# Altium footprint library Connectors SMD.PcbLib: 130 footprints (part 4 of 12)
Each footprint in its own frame and in the unit in brackets; x right, y up, seen from the top. Pads: shape width x height; smd on the part's side, far side on the other; paste and mask are expansions set on the pad; w line width, h text height; cw(c..) or ccw(c..) is an arc to the next point about the centre after c.
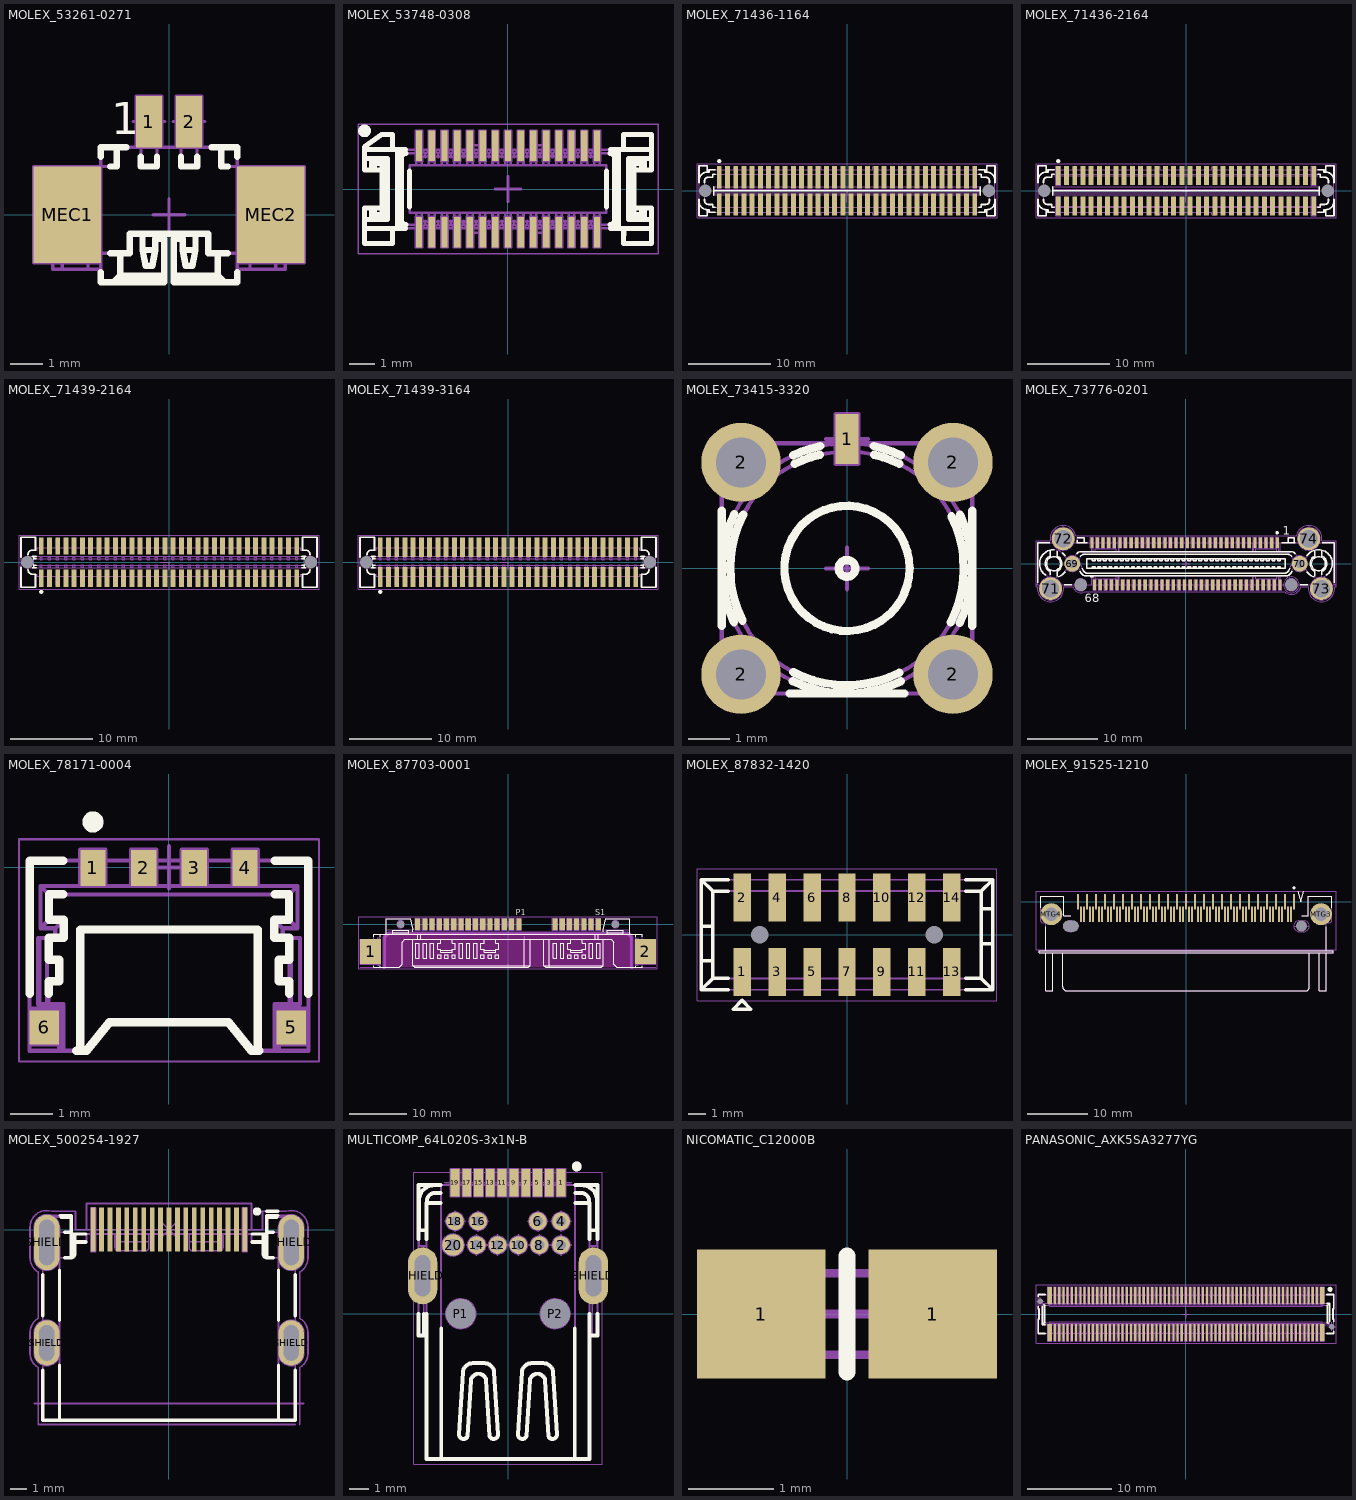
[diagram p3: the footprints below, top view; thin cyan lines are the x and y axes]

## MOLEX_53261-0271 [mm] "1.25mm (.049\") Pitch PicoBlade Surface Mount 2 Circuits Right Angle Header"
height 3.4
pads (4):
  rect 0.8x1.6 smd: 1(-0.625,2.9) 2(0.625,2.9)
  rect 2.1x3 smd: MEC1(-3.175,0) MEC2(3.175,0)
Top Overlay:
  lines w0.2: -2.125,-1.8 -2.125,-2.1 -0.15,-2.1 -0.15,-0.75 -0.425,-0.75 -0.425,-1.1 ; -2.125,1.8 -2.125,2.1 -1.325,2.1 ; -1.825,-1.2 -1.225,-1.2 -1.225,-0.6 1.225,-0.6 1.225,-1.2 1.825,-1.2 ; -1.825,1.5 -1.625,1.5 -1.625,2.1 ; -1.725,-2.1 -1.525,-1.9 ; -1.525,-1.2 -1.525,-1.9 ; -0.875,1.8 -0.875,1.5 -0.375,1.5 -0.375,1.8 ; -0.825,-0.6 -0.825,-1.1 ; -0.15,-1.9 -1.525,-1.9 ; 0.15,-1.9 1.525,-1.9 ; 0.375,1.8 0.375,1.5 0.875,1.5 0.875,1.8 ; 0.825,-0.6 0.825,-1.1 ; 1.325,2.1 2.125,2.1 2.125,1.8 ; 1.525,-1.2 1.525,-1.9 ; 1.625,2.1 1.625,1.5 1.825,1.5 ; 1.725,-2.1 1.525,-1.9 ; 2.125,-1.8 2.125,-2.1 0.15,-2.1 0.15,-0.75 0.425,-0.75 0.425,-1.1 ; -0.825,-1.1 -0.425,-1.1 ; -0.825,-1.1 -0.725,-1.6 -0.525,-1.6 -0.425,-1.1 ; 0.425,-1.1 0.525,-1.6 0.725,-1.6 0.825,-1.1 ; 0.425,-1.1 0.825,-1.1
  text "1" at -1.8,2.5 h1
Mechanical 8:
  lines w0.1: -3.675,0 -3.175,0 ; -3.175,-0.5 -3.175,0 ; -3.175,0.5 -3.175,0 ; -2.675,0 -3.175,0 ; -1.125,2.9 -0.625,2.9 ; -0.625,2.4 -0.625,2.9 ; -0.625,3.4 -0.625,2.9 ; -0.5,0 0,0 ; -0.125,2.9 -0.625,2.9 ; 0,-0.5 0,0 ; 0,0.5 0,0 ; 0.125,2.9 0.625,2.9 ; 0.5,0 0,0 ; 0.625,2.4 0.625,2.9 ; 0.625,3.4 0.625,2.9 ; 1.125,2.9 0.625,2.9 ; 2.675,0 3.175,0 ; 3.175,-0.5 3.175,0 ; 3.175,0.5 3.175,0 ; 3.675,0 3.175,0 ; -4.225,-1.5 -4.225,1.5 -2.125,1.5 -2.125,-1.5 -4.225,-1.5 ; -1.025,2.1 -0.225,2.1 -0.225,3.7 -1.025,3.7 -1.025,2.1 ; 0.225,2.1 0.225,3.7 1.025,3.7 1.025,2.1 0.225,2.1 ; 2.125,-1.5 4.225,-1.5 4.225,1.5 2.125,1.5 2.125,-1.5
Mechanical 14:
  lines w0.1: -3.625,-1.1 -3.825,-0.9 -3.825,0.9 -3.625,1.1 ; -3.325,-1.7 -3.325,1.1 ; -2.525,-1.7 -2.525,1.1 ; -2.145,1.1 -3.625,1.1 ; -2.125,-1.7 -3.625,-1.7 -3.625,1.1 ; -2.125,-1.2 -1.225,-1.2 -1.225,-0.6 1.225,-0.6 1.225,-1.2 2.125,-1.2 ; -2.125,1.5 -1.625,1.5 -1.625,2.1 ; -1.725,-2.1 -1.525,-1.9 ; -1.525,-1.2 -1.525,-1.9 ; -0.875,2.1 -0.875,1.5 -0.375,1.5 -0.375,2.1 ; -0.825,-0.6 -0.825,-1.1 ; -0.785,2.1 -0.785,3.1 -0.465,3.1 -0.465,2.1 ; -0.15,-1.9 -1.525,-1.9 ; 0.15,-1.9 1.525,-1.9 ; 0.375,2.1 0.375,1.5 0.875,1.5 0.875,2.1 ; 0.465,2.1 0.465,3.1 0.785,3.1 0.785,2.1 ; 0.825,-0.6 0.825,-1.1 ; 1.525,-1.2 1.525,-1.9 ; 1.625,2.1 1.625,1.5 2.125,1.5 ; 1.725,-2.1 1.525,-1.9 ; 2.125,-1.7 3.625,-1.7 3.625,1.1 ; 2.125,1.1 3.625,1.1 ; 2.525,-1.7 2.525,1.1 ; 3.325,-1.7 3.325,1.1 ; 3.625,-1.1 3.825,-0.9 3.825,0.9 3.625,1.1 ; -0.825,-1.1 -0.425,-1.1 ; -0.825,-1.1 -0.725,-1.6 -0.525,-1.6 -0.425,-1.1 ; -0.425,-1.1 -0.425,-0.75 -0.15,-0.75 -0.15,-2.1 -2.125,-2.1 -2.125,2.1 2.125,2.1 2.125,-2.1 0.15,-2.1 0.15,-0.75 0.425,-0.75 0.425,-1.1 ; 0.425,-1.1 0.525,-1.6 0.725,-1.6 0.825,-1.1 ; 0.425,-1.1 0.825,-1.1
  text "1" at -1.8,2.5 h1
3D body: height 3.4, standoff 0, extent -3.825,-2.1 3.825,3.1

## MOLEX_53748-0308 [mm] "0.50mm Pitch SlimStack Dual Row 30 Circuits Surface Mount Vertical Plug (3.00mm Stacking Heights)"
height 2.4
pads (30):
  rect 0.25x1.2 smd: 1(-3.5,1.7) 2(-3.5,-1.7) 3(-3,1.7) 4(-3,-1.7) 5(-2.5,1.7) 6(-2.5,-1.7) 7(-2,1.7) 8(-2,-1.7) 9(-1.5,1.7) 10(-1.5,-1.7) 11(-1,1.7) 12(-1,-1.7) 13(-0.5,1.7) 14(-0.5,-1.7) 15(0,1.7) 16(0,-1.7) 17(0.5,1.7) 18(0.5,-1.7) 19(1,1.7) 20(1,-1.7) 21(1.5,1.7) 22(1.5,-1.7) 23(2,1.7) 24(2,-1.7) 25(2.5,1.7) 26(2.5,-1.7) 27(3,1.7) 28(3,-1.7) 29(3.5,1.7) 30(3.5,-1.7)
Top Overlay:
  circle w0.25: c-5.644,2.286 r0.125
  lines w0.2: -5.65,-1.55 -4.025,-1.55 ; -5.65,-1.2 -4.75,-1.2 -4.75,1.2 -5.65,1.2 ; -5.65,1.55 -4.025,1.55 ; -5.37,-0.75 -5.37,-1.12 ; -5.37,0.75 -5.37,1.12 ; -5.25,-0.75 -5.25,-1 ; -5.25,0.75 -5.25,1 ; -4.95,-0.75 -5.65,-0.75 -5.65,-2.15 -4.55,-2.15 -4.55,-1.55 ; -4.95,0.75 -5.65,0.75 -5.65,1.66 -4.95,2.15 -4.55,2.15 -4.55,1.55 ; -4.35,-1.36 -4.2,-1.21 ; -4.35,1.36 -4.2,1.21 ; -4.16,-1.55 -4.01,-1.4 cw(c-4.014,-1.214) -4.2,-1.21 ; -4.16,1.55 -4.01,1.4 ccw(c-4.014,1.214) -4.2,1.21 ; -4.15,-1.55 cw(c-4.15,-1.35) -4.35,-1.35 -4.35,1.35 cw(c-4.15,1.35) -4.15,1.55 ; -3.87,-0.7 -3.87,0.7 ; 3.87,-0.7 3.87,0.7 ; 4.025,-1.55 5.65,-1.55 ; 4.025,1.55 5.65,1.55 ; 4.15,-1.55 ccw(c4.15,-1.35) 4.35,-1.36 ; 4.16,-1.55 4.01,-1.4 ccw(c4.014,-1.214) 4.2,-1.21 ; 4.35,1.359 ccw(c4.15,1.35) 4.16,1.55 4.01,1.4 cw(c4.014,1.214) 4.2,1.21 ; 4.55,1.55 4.55,2.15 5.65,2.15 5.65,0.75 4.95,0.75 ; 4.552,-1.55 4.55,-2.15 5.65,-2.15 5.65,-0.75 4.95,-0.75 ; 5.25,-0.75 5.25,-1 ; 5.25,0.75 5.25,1 ; 5.37,-0.75 5.37,-1.12 ; 5.37,0.75 5.37,1.12 ; 5.65,-1.2 4.75,-1.2 4.75,1.2 5.65,1.2 ; -5.37,-1.12 -4.83,-1.12 ; -5.37,-1.12 -5.25,-1 ; -5.37,1.12 -4.83,1.12 ; -5.37,1.12 -5.25,1 ; -5.25,-1 -4.95,-1 ; -5.25,1 -4.95,1 ; -4.95,-1 -4.95,1 ; -4.95,-1 -4.83,-1.12 ; -4.95,1 -4.83,1.12 ; -4.83,-1.12 -4.83,1.12 ; -4.2,-1.21 -4.2,1.21 ; 4.2,-1.21 4.35,-1.36 ; 4.2,-1.21 4.2,1.21 ; 4.2,1.21 4.35,1.36 4.35,-1.36 ; 4.83,-1.12 4.95,-1 ; 4.83,-1.12 5.37,-1.12 ; 4.83,-1.12 4.83,1.12 ; 4.83,1.12 5.37,1.12 ; 4.83,1.12 4.95,1 ; 4.95,-1 4.95,1 ; 4.95,-1 5.25,-1 ; 4.95,1 5.25,1 ; 5.25,-1 5.37,-1.12 ; 5.25,1 5.37,1.12
Mechanical 8:
  drawing of 184 lines, arcs and shapes, not listed
Mechanical 14:
  drawing of 354 lines, arcs and shapes, not listed
Mechanical 15:
  lines w0.05: -5.9,-2.55 -5.9,2.55 5.9,2.55 5.9,-2.55 -5.9,-2.55
3D body: height 2.42, standoff 0, extent -5.65,-2.15 5.65,2.15

## MOLEX_71436-1164 [mm] "1mm Centerline, FH (IEEE 1386) Surface Mount, Stacking Board-to-Board Male Connectors"
height 7.48
pads (66):
  rect 0.6x2.7 smd: 1(-15.5,1.65) 2(-15.5,-1.65) 3(-14.5,1.65) 4(-14.5,-1.65) 5(-13.5,1.65) 6(-13.5,-1.65) 7(-12.5,1.65) 8(-12.5,-1.65) 9(-11.5,1.65) 10(-11.5,-1.65) 11(-10.5,1.65) 12(-10.5,-1.65) 13(-9.5,1.65) 14(-9.5,-1.65) 15(-8.5,1.65) 16(-8.5,-1.65) 17(-7.5,1.65) 18(-7.5,-1.65) 19(-6.5,1.65) 20(-6.5,-1.65) 21(-5.5,1.65) 22(-5.5,-1.65) 23(-4.5,1.65) 24(-4.5,-1.65) 25(-3.5,1.65) 26(-3.5,-1.65) 27(-2.5,1.65) 28(-2.5,-1.65) 29(-1.5,1.65) 30(-1.5,-1.65) 31(-0.5,1.65) 32(-0.5,-1.65) 33(0.5,1.65) 34(0.5,-1.65) 35(1.5,1.65) 36(1.5,-1.65) 37(2.5,1.65) 38(2.5,-1.65) 39(3.5,1.65) 40(3.5,-1.65) 41(4.5,1.65) 42(4.5,-1.65) 43(5.5,1.65) 44(5.5,-1.65) 45(6.5,1.65) 46(6.5,-1.65) 47(7.5,1.65) 48(7.5,-1.65) 49(8.5,1.65) 50(8.5,-1.65) 51(9.5,1.65) 52(9.5,-1.65) 53(10.5,1.65) 54(10.5,-1.65) 55(11.5,1.65) 56(11.5,-1.65) 57(12.5,1.65) 58(12.5,-1.65) 59(13.5,1.65) 60(13.5,-1.65) 61(14.5,1.65) 62(14.5,-1.65) 63(15.5,1.65) 64(15.5,-1.65)
  round 1 hole 1.5 unplated: 65(-17.2,0) 66(17.2,0)
Top Overlay:
  circle w0.25: c-15.5,3.6 r0.125
  lines w0.2: -17.95,-1.275 ccw(c-16.95,-1.275) -16.95,-2.275 ; -17.95,-1 -17.95,-3.025 -16.95,-3.025 -16.95,-2.275 ; -17.95,1 -17.95,3.025 -16.95,3.025 -16.95,2.275 ; -17.95,1.275 cw(c-16.95,1.275) -16.95,2.275 ; -17.29,-1 -17.29,-1.2 ccw(c-16.84,-1.2) -16.84,-1.65 -16.3,-1.65 -16.3,-2 -16,-2 ; -17.29,1 -17.29,1.2 cw(c-16.84,1.2) -16.84,1.65 -16.3,1.65 -16.3,2 -16,2 ; -16.15,-0.5 -16.15,0.5 ; -16.15,0 16.15,0 ; -16,-2.575 -16.75,-2.575 -16.75,-2.275 -16.95,-2.275 ; -16,2.575 -16.75,2.575 -16.75,2.275 -16.95,2.275 ; 16,-2.575 16.75,-2.575 16.75,-2.275 16.95,-2.275 ; 16,-2 16.3,-2 16.3,-1.65 16.84,-1.65 ccw(c16.84,-1.2) 17.29,-1.2 17.29,-1 ; 16,2 16.3,2 16.3,1.65 16.84,1.65 cw(c16.84,1.2) 17.29,1.2 17.29,1 ; 16,2.575 16.75,2.575 16.75,2.275 16.95,2.275 ; 16.15,-0.5 16.15,0.5 ; 17.95,-1.275 cw(c16.95,-1.275) 16.95,-2.275 ; 17.95,-1 17.95,-3.025 16.95,-3.025 16.95,-2.275 ; 17.95,1 17.95,3.025 16.95,3.025 16.95,2.275 ; 17.95,1.275 ccw(c16.95,1.275) 16.95,2.275
Mechanical 14:
  drawing of 251 lines, arcs and shapes, not listed
Mechanical 15:
  lines w0.05: -18.2,-3.275 18.2,-3.275 18.2,3.275 -18.2,3.275 -18.2,-3.275
3D body: height 7.35, standoff -0.75, extent -17.95,-3.025 17.95,3.075

## MOLEX_71436-2164 [mm] "1mm Centerline, FH (IEEE 1386) Surface Mount, Stacking Board-to-Board Male Connectors"
height 8.48
pads (66):
  rect 0.6x2.3 smd: 1(-15.5,1.85) 2(-15.5,-1.85) 3(-14.5,1.85) 4(-14.5,-1.85) 5(-13.5,1.85) 6(-13.5,-1.85) 7(-12.5,1.85) 8(-12.5,-1.85) 9(-11.5,1.85) 10(-11.5,-1.85) 11(-10.5,1.85) 12(-10.5,-1.85) 13(-9.5,1.85) 14(-9.5,-1.85) 15(-8.5,1.85) 16(-8.5,-1.85) 17(-7.5,1.85) 18(-7.5,-1.85) 19(-6.5,1.85) 20(-6.5,-1.85) 21(-5.5,1.85) 22(-5.5,-1.85) 23(-4.5,1.85) 24(-4.5,-1.85) 25(-3.5,1.85) 26(-3.5,-1.85) 27(-2.5,1.85) 28(-2.5,-1.85) 29(-1.5,1.85) 30(-1.5,-1.85) 31(-0.5,1.85) 32(-0.5,-1.85) 33(0.5,1.85) 34(0.5,-1.85) 35(1.5,1.85) 36(1.5,-1.85) 37(2.5,1.85) 38(2.5,-1.85) 39(3.5,1.85) 40(3.5,-1.85) 41(4.5,1.85) 42(4.5,-1.85) 43(5.5,1.85) 44(5.5,-1.85) 45(6.5,1.85) 46(6.5,-1.85) 47(7.5,1.85) 48(7.5,-1.85) 49(8.5,1.85) 50(8.5,-1.85) 51(9.5,1.85) 52(9.5,-1.85) 53(10.5,1.85) 54(10.5,-1.85) 55(11.5,1.85) 56(11.5,-1.85) 57(12.5,1.85) 58(12.5,-1.85) 59(13.5,1.85) 60(13.5,-1.85) 61(14.5,1.85) 62(14.5,-1.85) 63(15.5,1.85) 64(15.5,-1.85)
  round 1 hole 1.5 unplated: 65(-17.2,0) 66(17.2,0)
Top Overlay:
  circle w0.25: c-15.5,3.6 r0.125
  lines w0.2: -17.95,-1.275 ccw(c-16.95,-1.275) -16.95,-2.275 ; -17.95,-1 -17.95,-3.025 -16.95,-3.025 -16.95,-2.275 ; -17.95,1 -17.95,3.025 -16.95,3.025 -16.95,2.275 ; -17.95,1.275 cw(c-16.95,1.275) -16.95,2.275 ; -17.29,-1 -17.29,-1.2 ccw(c-16.84,-1.2) -16.84,-1.65 -16.3,-1.65 -16.3,-2 -16,-2 ; -17.29,1 -17.29,1.2 cw(c-16.84,1.2) -16.84,1.65 -16.3,1.65 -16.3,2 -16,2 ; -16.15,-0.5 -16.15,0.5 ; -16.15,0 16.15,0 ; -16,-2.575 -16.75,-2.575 -16.75,-2.275 -16.95,-2.275 ; -16,2.575 -16.75,2.575 -16.75,2.275 -16.95,2.275 ; 16,-2.575 16.75,-2.575 16.75,-2.275 16.95,-2.275 ; 16,-2 16.3,-2 16.3,-1.65 16.84,-1.65 ccw(c16.84,-1.2) 17.29,-1.2 17.29,-1 ; 16,2 16.3,2 16.3,1.65 16.84,1.65 cw(c16.84,1.2) 17.29,1.2 17.29,1 ; 16,2.575 16.75,2.575 16.75,2.275 16.95,2.275 ; 16.15,-0.5 16.15,0.5 ; 17.95,-1.275 cw(c16.95,-1.275) 16.95,-2.275 ; 17.95,-1 17.95,-3.025 16.95,-3.025 16.95,-2.275 ; 17.95,1 17.95,3.025 16.95,3.025 16.95,2.275 ; 17.95,1.275 ccw(c16.95,1.275) 16.95,2.275
Mechanical 8:
  drawing of 284 lines, arcs and shapes, not listed
Mechanical 14:
  drawing of 251 lines, arcs and shapes, not listed
Mechanical 15:
  lines w0.05: -18.2,-3.275 -18.2,3.275 18.2,3.275 18.2,-3.275 -18.2,-3.275
3D body: height 8.35, standoff -0.75, extent -17.95,-3.05 17.95,3.05

## MOLEX_71439-2164 [mm] "2x32 Position, 1mm Centerline, Surface Mount, Stacking Board-to-Board Female Connector (IEEE 1386 Mezzanine Connector)"
height 8.48
pads (66):
  rect 0.6x2.1 smd: 1(-15.5,-1.95) 2(-15.5,1.95) 3(-14.5,-1.95) 4(-14.5,1.95) 5(-13.5,-1.95) 6(-13.5,1.95) 7(-12.5,-1.95) 8(-12.5,1.95) 9(-11.5,-1.95) 10(-11.5,1.95) 11(-10.5,-1.95) 12(-10.5,1.95) 13(-9.5,-1.95) 14(-9.5,1.95) 15(-8.5,-1.95) 16(-8.5,1.95) 17(-7.5,-1.95) 18(-7.5,1.95) 19(-6.5,-1.95) 20(-6.5,1.95) 21(-5.5,-1.95) 22(-5.5,1.95) 23(-4.5,-1.95) 24(-4.5,1.95) 25(-3.5,-1.95) 26(-3.5,1.95) 27(-2.5,-1.95) 28(-2.5,1.95) 29(-1.5,-1.95) 30(-1.5,1.95) 31(-0.5,-1.95) 32(-0.5,1.95) 33(0.5,-1.95) 34(0.5,1.95) 35(1.5,-1.95) 36(1.5,1.95) 37(2.5,-1.95) 38(2.5,1.95) 39(3.5,-1.95) 40(3.5,1.95) 41(4.5,-1.95) 42(4.5,1.95) 43(5.5,-1.95) 44(5.5,1.95) 45(6.5,-1.95) 46(6.5,1.95) 47(7.5,-1.95) 48(7.5,1.95) 49(8.5,-1.95) 50(8.5,1.95) 51(9.5,-1.95) 52(9.5,1.95) 53(10.5,-1.95) 54(10.5,1.95) 55(11.5,-1.95) 56(11.5,1.95) 57(12.5,-1.95) 58(12.5,1.95) 59(13.5,-1.95) 60(13.5,1.95) 61(14.5,-1.95) 62(14.5,1.95) 63(15.5,-1.95) 64(15.5,1.95)
  round 1 hole 1.5 unplated: 65(-17.2,0) 66(17.2,0)
Top Overlay:
  circle w0.25: c-15.5,-3.6 r0.125
  lines w0.2: -17.95,-0.6 -17.95,-3.025 -16.2,-3.025 -16.2,-1.46 -16.56,-1.46 cw(c-16.56,-0.91) -17.11,-0.91 ; -17.95,0.6 -17.95,3.025 -16.2,3.025 -16.2,1.46 -16.56,1.46 ccw(c-16.56,0.91) -17.11,0.91 ; -16.6,-0.69 -16.1,-0.69 ; -16.6,0.69 -16.1,0.69 ; -16.4,-0.69 -16.4,-0.345 ; -16.4,-0.396 -16.1,-0.396 ; -16.4,0.345 -16.4,0.69 ; -16.4,0.396 -16.1,0.396 ; 16.1,-0.69 16.6,-0.69 ; 16.1,-0.396 16.4,-0.396 ; 16.1,0.396 16.4,0.396 ; 16.1,0.69 16.6,0.69 ; 16.4,-0.69 16.4,-0.345 ; 16.4,0.345 16.4,0.69 ; 17.11,-0.91 cw(c16.56,-0.91) 16.56,-1.46 16.2,-1.46 16.2,-3.025 17.95,-3.025 17.95,-0.6 ; 17.11,0.91 ccw(c16.56,0.91) 16.56,1.46 16.2,1.46 16.2,3.025 17.95,3.025 17.95,0.6
Mechanical 8:
  lines w0.1: -1,0 0,0 0,-1
Mechanical 14:
  drawing of 608 lines, arcs and shapes, not listed
Mechanical 15:
  lines w0.05: -18.2,-3.275 -18.2,3.275 18.2,3.275 18.2,-3.275 -18.2,-3.275
3D body: height 10.31, standoff -0.79, extent -17.95,-3.05 17.95,3.05

## MOLEX_71439-3164 [mm] "2x32 Position, 1mm Centerline, Surface Mount, Stacking Board-to-Board Female Connector (IEEE 1386 Mezzanine Connector)"
height 10.48
pads (66):
  rect 0.6x2.4 smd: 1(-15.5,-1.8) 2(-15.5,1.8) 3(-14.5,-1.8) 4(-14.5,1.8) 5(-13.5,-1.8) 6(-13.5,1.8) 7(-12.5,-1.8) 8(-12.5,1.8) 9(-11.5,-1.8) 10(-11.5,1.8) 11(-10.5,-1.8) 12(-10.5,1.8) 13(-9.5,-1.8) 14(-9.5,1.8) 15(-8.5,-1.8) 16(-8.5,1.8) 17(-7.5,-1.8) 18(-7.5,1.8) 19(-6.5,-1.8) 20(-6.5,1.8) 21(-5.5,-1.8) 22(-5.5,1.8) 23(-4.5,-1.8) 24(-4.5,1.8) 25(-3.5,-1.8) 26(-3.5,1.8) 27(-2.5,-1.8) 28(-2.5,1.8) 29(-1.5,-1.8) 30(-1.5,1.8) 31(-0.5,-1.8) 32(-0.5,1.8) 33(0.5,-1.8) 34(0.5,1.8) 35(1.5,-1.8) 36(1.5,1.8) 37(2.5,-1.8) 38(2.5,1.8) 39(3.5,-1.8) 40(3.5,1.8) 41(4.5,-1.8) 42(4.5,1.8) 43(5.5,-1.8) 44(5.5,1.8) 45(6.5,-1.8) 46(6.5,1.8) 47(7.5,-1.8) 48(7.5,1.8) 49(8.5,-1.8) 50(8.5,1.8) 51(9.5,-1.8) 52(9.5,1.8) 53(10.5,-1.8) 54(10.5,1.8) 55(11.5,-1.8) 56(11.5,1.8) 57(12.5,-1.8) 58(12.5,1.8) 59(13.5,-1.8) 60(13.5,1.8) 61(14.5,-1.8) 62(14.5,1.8) 63(15.5,-1.8) 64(15.5,1.8)
  round 1 hole 1.5 unplated: 65(-17.2,0) 66(17.2,0)
Top Overlay:
  circle w0.25: c-15.5,-3.6 r0.125
  lines w0.2: -17.95,-0.6 -17.95,-3.025 -16.2,-3.025 -16.2,-1.46 -16.56,-1.46 cw(c-16.56,-0.91) -17.11,-0.91 ; -17.95,0.6 -17.95,3.025 -16.2,3.025 -16.2,1.46 -16.56,1.46 ccw(c-16.56,0.91) -17.11,0.91 ; -16.6,-0.69 -16.1,-0.69 ; -16.6,0.69 -16.1,0.69 ; -16.4,-0.69 -16.4,-0.345 ; -16.4,-0.396 -16.1,-0.396 ; -16.4,0.345 -16.4,0.69 ; -16.4,0.396 -16.1,0.396 ; 16.1,-0.69 16.6,-0.69 ; 16.1,-0.396 16.4,-0.396 ; 16.1,0.396 16.4,0.396 ; 16.1,0.69 16.6,0.69 ; 16.4,-0.69 16.4,-0.345 ; 16.4,0.345 16.4,0.69 ; 17.11,-0.91 cw(c16.56,-0.91) 16.56,-1.46 16.2,-1.46 16.2,-3.025 17.95,-3.025 17.95,-0.6 ; 17.11,0.91 ccw(c16.56,0.91) 16.56,1.46 16.2,1.46 16.2,3.025 17.95,3.025 17.95,0.6
Mechanical 8:
  lines w0.1: -1,0 0,0 0,-1
Mechanical 14:
  drawing of 608 lines, arcs and shapes, not listed
Mechanical 15:
  lines w0.05: -18.2,-3.275 -18.2,3.275 18.2,3.275 18.2,-3.275 -18.2,-3.275
3D body: height 10.31, standoff -0.79, extent -17.95,-3.025 17.95,3.075

## MOLEX_73415-3320 [mm] "50 Ohm SMP Vertical Plug"
height 4.1
pads (5):
  rect 0.54x1.2 smd: 1(0,3.1)
  round 1.9 hole 1.2: 2(-2.54,-2.54) 2(-2.54,2.54) 2(2.54,-2.54) 2(2.54,2.54)
Top Overlay:
  circle w0.2: c0,0 r1.5
  circle w0.2: c0,0 r0.2
  lines w0.2: -3,-1.378 -3,1.378 ; -2.709,-1.29 cw(c0,0) -2.703,1.301 ; -2.504,-1.252 cw(c0,0) -2.484,1.291 ; -1.378,-3 1.378,-3 ; -1.301,-2.703 ccw(c0,0) 1.29,-2.709 ; -1.291,-2.484 ccw(c0,0) 1.252,-2.504 ; -1.29,2.709 cw(c0,0) -0.637,2.932 ; -1.252,2.504 cw(c0,0) -0.649,2.724 ; 0.637,2.932 cw(c0,0) 1.29,2.709 ; 0.649,2.724 cw(c0,0) 1.252,2.504 ; 2.484,-1.291 ccw(c0,0) 2.504,1.252 ; 2.703,-1.301 ccw(c0,0) 2.709,1.29 ; 3,-1.378 3,1.378
Mechanical 8:
  lines w0.1: -3.04,-2.54 -2.54,-2.54 ; -3.04,2.54 -2.54,2.54 ; -2.54,-3.04 -2.54,-2.54 ; -2.54,-2.04 -2.54,-2.54 ; -2.54,2.04 -2.54,2.54 ; -2.54,3.04 -2.54,2.54 ; -2.04,-2.54 -2.54,-2.54 ; -2.04,2.54 -2.54,2.54 ; -0.5,0 0,0 ; -0.5,3.1 0,3.1 ; 0,-0.5 0,0 ; 0,0.5 0,0 ; 0,2.6 0,3.1 ; 0,3.6 0,3.1 ; 0.5,0 0,0 ; 0.5,3.1 0,3.1 ; 2.04,-2.54 2.54,-2.54 ; 2.04,2.54 2.54,2.54 ; 2.54,-3.04 2.54,-2.54 ; 2.54,-2.04 2.54,-2.54 ; 2.54,2.04 2.54,2.54 ; 2.54,3.04 2.54,2.54 ; 3.04,-2.54 2.54,-2.54 ; 3.04,2.54 2.54,2.54 ; -0.27,2.5 0.27,2.5 0.27,3.7 -0.27,3.7 -0.27,2.5
Mechanical 14:
  circle w0.1: c0,0 r3
  circle w0.1: c0,0 r2.8
  circle w0.1: c0,0 r1.5
  circle w0.1: c0,0 r0.2
  lines w0.1: -0.2,3 -0.2,3.5 0.2,3.5 0.2,3 ; -3,-2.7 -2.7,-3 2.7,-3 3,-2.7 3,2.7 2.7,3 -2.7,3 -3,2.7 -3,-2.7
3D body: height 4.1, standoff -2.2, extent -3,-3 3,3.5

## MOLEX_73776-0201 [mm] "0.80mm Pitch, 68 Contacts, Ultra+ VHDCI Surface Mount Vertical Receptacle With Screwlock Kit"
height 10.7
pads (76):
  rect 0.45x1.5 smd: 1(13,3) 2(12.2,3) 3(11.4,3) 4(10.6,3) 5(9.8,3) 6(9,3) 7(8.2,3) 8(7.4,3) 9(6.6,3) 10(5.8,3) 11(5,3) 12(4.2,3) 13(3.4,3) 14(2.6,3) 15(1.8,3) 16(1,3) 17(0.2,3) 18(-0.6,3) 19(-1.4,3) 20(-2.2,3) 21(-3,3) 22(-3.8,3) 23(-4.6,3) 24(-5.4,3) 25(-6.2,3) 26(-7,3) 27(-7.8,3) 28(-8.6,3) 29(-9.4,3) 30(-10.2,3) 31(-11,3) 32(-11.8,3) 33(-12.6,3) 34(-13.4,3) 35(13.4,-3) 36(12.6,-3) 37(11.8,-3) 38(11,-3) 39(10.2,-3) 40(9.4,-3) 41(8.6,-3) 42(7.8,-3) 43(7,-3) 44(6.2,-3) 45(5.4,-3) 46(4.6,-3) 47(3.8,-3) 48(3,-3) 49(2.2,-3) 50(1.4,-3) 51(0.6,-3) 52(-0.2,-3) 53(-1,-3) 54(-1.8,-3) 55(-2.6,-3) 56(-3.4,-3) 57(-4.2,-3) 58(-5,-3) 59(-5.8,-3) 60(-6.6,-3) 61(-7.4,-3) 62(-8.2,-3) 63(-9,-3) 64(-9.8,-3) 65(-10.6,-3) 66(-11.4,-3) 67(-12.2,-3) 68(-13,-3)
  round 2.25 hole 1.2: 69(-16.175,0) 70(16.175,0)
  round 3.24 hole 2.45: 71(-19.275,-3.55) 72(-17.485,3.55) 73(19.275,-3.55) 74(17.485,3.55)
  round 1 hole 1.75 unplated mask+0.375: 75(-14.995,-3) 75(14.995,-3)
Top Overlay:
  drawing of 259 lines, arcs and shapes, not listed
  text "68" at -14.4,-5.5 h1.2
  text "1" at 13.8,4.1 h1.2
Mechanical 8:
  drawing of 527 lines, arcs and shapes, not listed
Mechanical 14:
  drawing of 520 lines, arcs and shapes, not listed
  text "68" at -14.4,-5.5 h1.2
  text "1" at 13.8,4.1 h1.2
Mechanical 15:
  lines w0.05: -17.429,-3.25 cw(c-19.275,-3.55) -21.121,-3.25 -21.35,-3.25 -21.35,3.25 -19.331,3.25 cw(c-17.485,3.55) -15.67,4 15.67,4 cw(c17.485,3.55) 19.331,3.25 21.35,3.25 21.35,-3.25 21.121,-3.25 cw(c19.275,-3.55) 17.429,-3.25 16.347,-3.25 cw(c14.995,-3) 14.051,-4 -14.48,-4 cw(c-14.995,-3) -16.092,-3.25 ; -17.429,-3.25 -16.092,-3.25 ; -17.429,-3.25 -16.092,-3.25
3D body: height 10.7, standoff -6.2, extent -21.25,-3.73 21.25,3.73
